# Altium integrated library Weidmueller_OMNIMATE_Signal.IntLib: 2550 symbols (part 10 of 45) (continued)
## 1331770000 (continued)
OMNIMATE Signal - series LMF; PartNumber: 1331770000; Manufacturer: Weidmueller; Short_text_for_material: LMF 5.00/08/90 3.5SN OR BX; Pitch_mm: 5 mm; Pitch_inch: 0,197 inch; No_of_poles: 8; Solder_pin_length_mm: 3,5 mm; Contact_material: CuSn; Contact_surface: tinned; Insulating_material: Wemid (PA); UL_94_flammability_rating: V-0; Rated_voltage_for_surge_voltage_class_pollution_degree_II_2: 400 V; Rated_current_min_no_of_poles_TU_20_deg_C: 32 A; Solid_min_H05_07_V_U: 0,2 mm²; Solid_max_H05_07_V_U: 2,5 mm²; Rated_voltage_use_group_B_UL_1059: 300 V; Rated_current_use_group_B_UL_1059: 20 A; Wire_cross_section_AWG_min_UL_1059: AWG 26; Wire_cross_section_AWG_max_UL_1059: AWG 12; PackageReference: LMF_5_00_90_08; Colour: Orange; Packaging: Box; Qty: 35 PCS; Revision: V1; ComponentLink1Description: Manufacturer URL; ComponentLink1URL: http://www.weidmueller.com/; ComponentLink2Description: URL Link1; ComponentLink2URL: http://catalog.weidmueller.com/catalog/Start.do?localeId=en&ObjectID=1331770000
footprint LMF_5_00_90_08 (OMNIMATE Signal - Serie LMF  LMF 5.00/08/90 3.5SN)
pins: A1, A2, A3, A4, A5, A6, A7, A8
1 alternate drawing of the same symbol

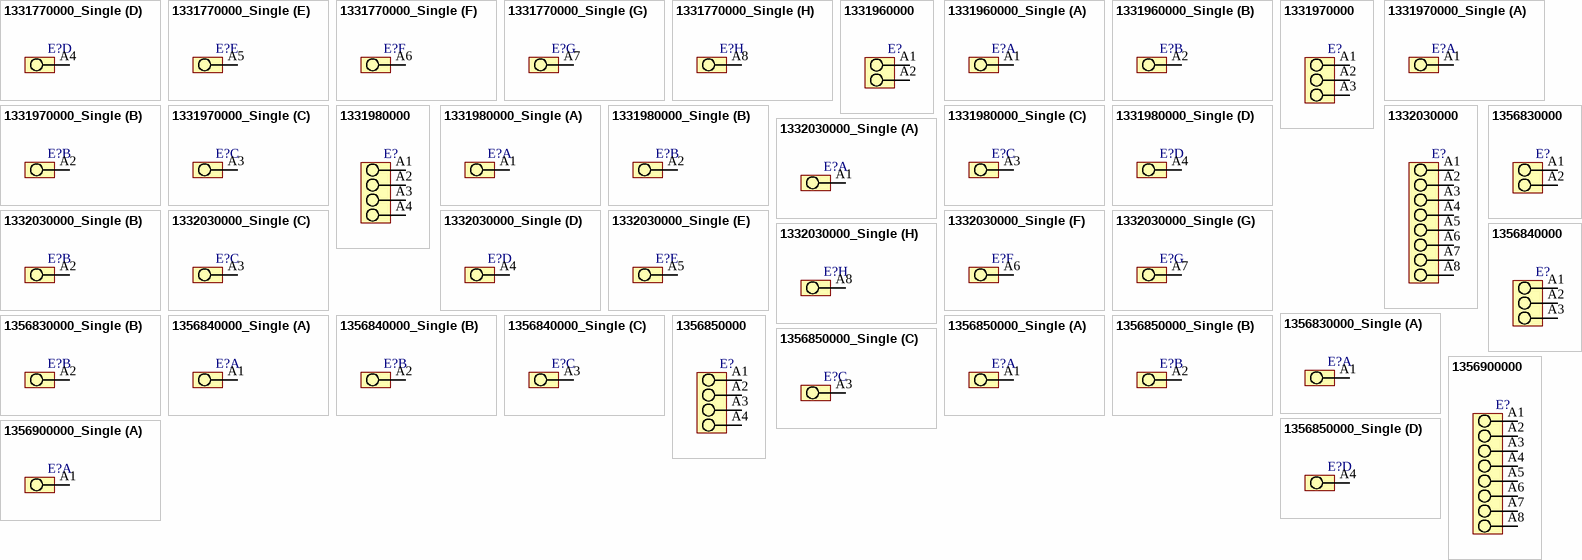
[diagram p57: symbols 1331770000_Single to 1356900000_Single]

## 1331770000_Single
designator E?
OMNIMATE Signal - series LMF; PartNumber: 1331770000; Manufacturer: Weidmueller; Short_text_for_material: LMF 5.00/08/90 3.5SN OR BX; Pitch_mm: 5 mm; Pitch_inch: 0,197 inch; No_of_poles: 8; Solder_pin_length_mm: 3,5 mm; Contact_material: CuSn; Contact_surface: tinned; Insulating_material: Wemid (PA); UL_94_flammability_rating: V-0; Rated_voltage_for_surge_voltage_class_pollution_degree_II_2: 400 V; Rated_current_min_no_of_poles_TU_20_deg_C: 32 A; Solid_min_H05_07_V_U: 0,2 mm²; Solid_max_H05_07_V_U: 2,5 mm²; Rated_voltage_use_group_B_UL_1059: 300 V; Rated_current_use_group_B_UL_1059: 20 A; Wire_cross_section_AWG_min_UL_1059: AWG 26; Wire_cross_section_AWG_max_UL_1059: AWG 12; PackageReference: LMF_5_00_90_08; Colour: Orange; Packaging: Box; Qty: 35 PCS; Revision: V1; ComponentLink1Description: Manufacturer URL; ComponentLink1URL: http://www.weidmueller.com/; ComponentLink2Description: URL Link1; ComponentLink2URL: http://catalog.weidmueller.com/catalog/Start.do?localeId=en&ObjectID=1331770000
footprint LMF_5_00_90_08 (OMNIMATE Signal - Serie LMF  LMF 5.00/08/90 3.5SN)
part A pins: A1
part B pins: A2
part C pins: A3
part D pins: A4
part E pins: A5
part F pins: A6
part G pins: A7
part H pins: A8
1 alternate drawing of the same symbol

## 1331960000
designator E?
OMNIMATE Signal - series LMF; PartNumber: 1331960000; Manufacturer: Weidmueller; Short_text_for_material: LMFS 5.00/02/90 3.5SN OR BX; Pitch_mm: 5 mm; Pitch_inch: 0,197 inch; No_of_poles: 2; Solder_pin_length_mm: 3,5 mm; Contact_material: CuSn; Contact_surface: tinned; Insulating_material: Wemid (PA); UL_94_flammability_rating: V-0; Rated_voltage_for_surge_voltage_class_pollution_degree_II_2: 400 V; Rated_current_min_no_of_poles_TU_20_deg_C: 32 A; Solid_min_H05_07_V_U: 0,2 mm²; Solid_max_H05_07_V_U: 2,5 mm²; Rated_voltage_use_group_B_UL_1059: 300 V; Rated_current_use_group_B_UL_1059: 20 A; Wire_cross_section_AWG_min_UL_1059: AWG 26; Wire_cross_section_AWG_max_UL_1059: AWG 12; PackageReference: LMFS_5_00_90_02; Colour: Orange; Packaging: Box; Qty: 130 PCS; Revision: V1; ComponentLink1Description: Manufacturer URL; ComponentLink1URL: http://www.weidmueller.com/; ComponentLink2Description: URL Link1; ComponentLink2URL: http://catalog.weidmueller.com/catalog/Start.do?localeId=en&ObjectID=1331960000
footprint LMFS_5_00_90_02 (OMNIMATE Signal - Serie LMF  LMFS 5.00/02/90 3.5)
pins: A1, A2
1 alternate drawing of the same symbol

## 1331960000_Single
designator E?
OMNIMATE Signal - series LMF; PartNumber: 1331960000; Manufacturer: Weidmueller; Short_text_for_material: LMFS 5.00/02/90 3.5SN OR BX; Pitch_mm: 5 mm; Pitch_inch: 0,197 inch; No_of_poles: 2; Solder_pin_length_mm: 3,5 mm; Contact_material: CuSn; Contact_surface: tinned; Insulating_material: Wemid (PA); UL_94_flammability_rating: V-0; Rated_voltage_for_surge_voltage_class_pollution_degree_II_2: 400 V; Rated_current_min_no_of_poles_TU_20_deg_C: 32 A; Solid_min_H05_07_V_U: 0,2 mm²; Solid_max_H05_07_V_U: 2,5 mm²; Rated_voltage_use_group_B_UL_1059: 300 V; Rated_current_use_group_B_UL_1059: 20 A; Wire_cross_section_AWG_min_UL_1059: AWG 26; Wire_cross_section_AWG_max_UL_1059: AWG 12; PackageReference: LMFS_5_00_90_02; Colour: Orange; Packaging: Box; Qty: 130 PCS; Revision: V1; ComponentLink1Description: Manufacturer URL; ComponentLink1URL: http://www.weidmueller.com/; ComponentLink2Description: URL Link1; ComponentLink2URL: http://catalog.weidmueller.com/catalog/Start.do?localeId=en&ObjectID=1331960000
footprint LMFS_5_00_90_02 (OMNIMATE Signal - Serie LMF  LMFS 5.00/02/90 3.5)
part A pins: A1
part B pins: A2
1 alternate drawing of the same symbol

## 1331970000
designator E?
OMNIMATE Signal - series LMF; PartNumber: 1331970000; Manufacturer: Weidmueller; Short_text_for_material: LMFS 5.00/03/90 3.5SN OR BX; Pitch_mm: 5 mm; Pitch_inch: 0,197 inch; No_of_poles: 3; Solder_pin_length_mm: 3,5 mm; Contact_material: CuSn; Contact_surface: tinned; Insulating_material: Wemid (PA); UL_94_flammability_rating: V-0; Rated_voltage_for_surge_voltage_class_pollution_degree_II_2: 400 V; Rated_current_min_no_of_poles_TU_20_deg_C: 32 A; Solid_min_H05_07_V_U: 0,2 mm²; Solid_max_H05_07_V_U: 2,5 mm²; Rated_voltage_use_group_B_UL_1059: 300 V; Rated_current_use_group_B_UL_1059: 20 A; Wire_cross_section_AWG_min_UL_1059: AWG 26; Wire_cross_section_AWG_max_UL_1059: AWG 12; PackageReference: LMFS_5_00_90_03; Colour: Orange; Packaging: Box; Qty: 90 PCS; Revision: V1; ComponentLink1Description: Manufacturer URL; ComponentLink1URL: http://www.weidmueller.com/; ComponentLink2Description: URL Link1; ComponentLink2URL: http://catalog.weidmueller.com/catalog/Start.do?localeId=en&ObjectID=1331970000
footprint LMFS_5_00_90_03 (OMNIMATE Signal - Serie LMF  LMFS 5.00/03/90 3.5)
pins: A1, A2, A3
1 alternate drawing of the same symbol

## 1331970000_Single
designator E?
OMNIMATE Signal - series LMF; PartNumber: 1331970000; Manufacturer: Weidmueller; Short_text_for_material: LMFS 5.00/03/90 3.5SN OR BX; Pitch_mm: 5 mm; Pitch_inch: 0,197 inch; No_of_poles: 3; Solder_pin_length_mm: 3,5 mm; Contact_material: CuSn; Contact_surface: tinned; Insulating_material: Wemid (PA); UL_94_flammability_rating: V-0; Rated_voltage_for_surge_voltage_class_pollution_degree_II_2: 400 V; Rated_current_min_no_of_poles_TU_20_deg_C: 32 A; Solid_min_H05_07_V_U: 0,2 mm²; Solid_max_H05_07_V_U: 2,5 mm²; Rated_voltage_use_group_B_UL_1059: 300 V; Rated_current_use_group_B_UL_1059: 20 A; Wire_cross_section_AWG_min_UL_1059: AWG 26; Wire_cross_section_AWG_max_UL_1059: AWG 12; PackageReference: LMFS_5_00_90_03; Colour: Orange; Packaging: Box; Qty: 90 PCS; Revision: V1; ComponentLink1Description: Manufacturer URL; ComponentLink1URL: http://www.weidmueller.com/; ComponentLink2Description: URL Link1; ComponentLink2URL: http://catalog.weidmueller.com/catalog/Start.do?localeId=en&ObjectID=1331970000
footprint LMFS_5_00_90_03 (OMNIMATE Signal - Serie LMF  LMFS 5.00/03/90 3.5)
part A pins: A1
part B pins: A2
part C pins: A3
1 alternate drawing of the same symbol

## 1331980000
designator E?
OMNIMATE Signal - series LMF; PartNumber: 1331980000; Manufacturer: Weidmueller; Short_text_for_material: LMFS 5.00/04/90 3.5SN OR BX; Pitch_mm: 5 mm; Pitch_inch: 0,197 inch; No_of_poles: 4; Solder_pin_length_mm: 3,5 mm; Contact_material: CuSn; Contact_surface: tinned; Insulating_material: Wemid (PA); UL_94_flammability_rating: V-0; Rated_voltage_for_surge_voltage_class_pollution_degree_II_2: 400 V; Rated_current_min_no_of_poles_TU_20_deg_C: 32 A; Solid_min_H05_07_V_U: 0,2 mm²; Solid_max_H05_07_V_U: 2,5 mm²; Rated_voltage_use_group_B_UL_1059: 300 V; Rated_current_use_group_B_UL_1059: 20 A; Wire_cross_section_AWG_min_UL_1059: AWG 26; Wire_cross_section_AWG_max_UL_1059: AWG 12; PackageReference: LMFS_5_00_90_04; Colour: Orange; Packaging: Box; Qty: 70 PCS; Revision: V1; ComponentLink1Description: Manufacturer URL; ComponentLink1URL: http://www.weidmueller.com/; ComponentLink2Description: URL Link1; ComponentLink2URL: http://catalog.weidmueller.com/catalog/Start.do?localeId=en&ObjectID=1331980000
footprint LMFS_5_00_90_04 (OMNIMATE Signal - Serie LMF  LMFS 5.00/04/90 3.5)
pins: A1, A2, A3, A4
1 alternate drawing of the same symbol

## 1331980000_Single
designator E?
OMNIMATE Signal - series LMF; PartNumber: 1331980000; Manufacturer: Weidmueller; Short_text_for_material: LMFS 5.00/04/90 3.5SN OR BX; Pitch_mm: 5 mm; Pitch_inch: 0,197 inch; No_of_poles: 4; Solder_pin_length_mm: 3,5 mm; Contact_material: CuSn; Contact_surface: tinned; Insulating_material: Wemid (PA); UL_94_flammability_rating: V-0; Rated_voltage_for_surge_voltage_class_pollution_degree_II_2: 400 V; Rated_current_min_no_of_poles_TU_20_deg_C: 32 A; Solid_min_H05_07_V_U: 0,2 mm²; Solid_max_H05_07_V_U: 2,5 mm²; Rated_voltage_use_group_B_UL_1059: 300 V; Rated_current_use_group_B_UL_1059: 20 A; Wire_cross_section_AWG_min_UL_1059: AWG 26; Wire_cross_section_AWG_max_UL_1059: AWG 12; PackageReference: LMFS_5_00_90_04; Colour: Orange; Packaging: Box; Qty: 70 PCS; Revision: V1; ComponentLink1Description: Manufacturer URL; ComponentLink1URL: http://www.weidmueller.com/; ComponentLink2Description: URL Link1; ComponentLink2URL: http://catalog.weidmueller.com/catalog/Start.do?localeId=en&ObjectID=1331980000
footprint LMFS_5_00_90_04 (OMNIMATE Signal - Serie LMF  LMFS 5.00/04/90 3.5)
part A pins: A1
part B pins: A2
part C pins: A3
part D pins: A4
1 alternate drawing of the same symbol

## 1332030000
designator E?
OMNIMATE Signal - series LMF; PartNumber: 1332030000; Manufacturer: Weidmueller; Short_text_for_material: LMFS 5.00/08/90 3.5SN OR BX; Pitch_mm: 5 mm; Pitch_inch: 0,197 inch; No_of_poles: 8; Solder_pin_length_mm: 3,5 mm; Contact_material: CuSn; Contact_surface: tinned; Insulating_material: Wemid (PA); UL_94_flammability_rating: V-0; Rated_voltage_for_surge_voltage_class_pollution_degree_II_2: 400 V; Rated_current_min_no_of_poles_TU_20_deg_C: 32 A; Solid_min_H05_07_V_U: 0,2 mm²; Solid_max_H05_07_V_U: 2,5 mm²; Rated_voltage_use_group_B_UL_1059: 300 V; Rated_current_use_group_B_UL_1059: 20 A; Wire_cross_section_AWG_min_UL_1059: AWG 26; Wire_cross_section_AWG_max_UL_1059: AWG 12; PackageReference: LMFS_5_00_90_08; Colour: Orange; Packaging: Box; Qty: 35 PCS; Revision: V1; ComponentLink1Description: Manufacturer URL; ComponentLink1URL: http://www.weidmueller.com/; ComponentLink2Description: URL Link1; ComponentLink2URL: http://catalog.weidmueller.com/catalog/Start.do?localeId=en&ObjectID=1332030000
footprint LMFS_5_00_90_08 (OMNIMATE Signal - Serie LMF  LMFS 5.00/08/90 3.5)
pins: A1, A2, A3, A4, A5, A6, A7, A8
1 alternate drawing of the same symbol

## 1332030000_Single
designator E?
OMNIMATE Signal - series LMF; PartNumber: 1332030000; Manufacturer: Weidmueller; Short_text_for_material: LMFS 5.00/08/90 3.5SN OR BX; Pitch_mm: 5 mm; Pitch_inch: 0,197 inch; No_of_poles: 8; Solder_pin_length_mm: 3,5 mm; Contact_material: CuSn; Contact_surface: tinned; Insulating_material: Wemid (PA); UL_94_flammability_rating: V-0; Rated_voltage_for_surge_voltage_class_pollution_degree_II_2: 400 V; Rated_current_min_no_of_poles_TU_20_deg_C: 32 A; Solid_min_H05_07_V_U: 0,2 mm²; Solid_max_H05_07_V_U: 2,5 mm²; Rated_voltage_use_group_B_UL_1059: 300 V; Rated_current_use_group_B_UL_1059: 20 A; Wire_cross_section_AWG_min_UL_1059: AWG 26; Wire_cross_section_AWG_max_UL_1059: AWG 12; PackageReference: LMFS_5_00_90_08; Colour: Orange; Packaging: Box; Qty: 35 PCS; Revision: V1; ComponentLink1Description: Manufacturer URL; ComponentLink1URL: http://www.weidmueller.com/; ComponentLink2Description: URL Link1; ComponentLink2URL: http://catalog.weidmueller.com/catalog/Start.do?localeId=en&ObjectID=1332030000
footprint LMFS_5_00_90_08 (OMNIMATE Signal - Serie LMF  LMFS 5.00/08/90 3.5)
part A pins: A1
part B pins: A2
part C pins: A3
part D pins: A4
part E pins: A5
part F pins: A6
part G pins: A7
part H pins: A8
1 alternate drawing of the same symbol

## 1356830000
designator E?
OMNIMATE Signal - series LL; PartNumber: 1356830000; Manufacturer: Weidmueller; Short_text_for_material: LL 6.35/02/90V 5.0SN BK BX; Side_termination_characteristic: closed side; Mounting_onto_the_PCB: Solder connection; Pitch_mm: 6,35 mm; Pitch_inch: 0,25 inch; No_of_poles: 2; Solder_pin_length_mm: 5 mm; Contact_material: Cu-Leg; Contact_surface: tinned; Insulating_material: Wemid (PA); UL_94_flammability_rating: V-0; Rated_voltage_for_surge_voltage_class_pollution_degree_II_2: 1000 V; Rated_current_min_no_of_poles_TU_20_deg_C: 32 A; Solid_min_H05_07_V_U: 0,18 mm²; Solid_max_H05_07_V_U: 6 mm²; Rated_voltage_use_group_B_UL_1059: 600 V; Rated_current_use_group_B_UL_1059: 30 A; Wire_cross_section_AWG_min_UL_1059: AWG 26; Wire_cross_section_AWG_max_UL_1059: AWG 10; PackageReference: LL_6_35_90V_02; Colour: Black; Packaging: Box; Qty: 50 PCS; Revision: V1; ComponentLink1Description: Manufacturer URL; ComponentLink1URL: http://www.weidmueller.com/; ComponentLink2Description: URL Link1; ComponentLink2URL: http://catalog.weidmueller.com/catalog/Start.do?localeId=en&ObjectID=1356830000
footprint LL_6_35_90V_02 (OMNIMATE Signal - Serie LL  LL 6.35/02/90V 5.0)
pins: A1, A2
1 alternate drawing of the same symbol

## 1356830000_Single
designator E?
OMNIMATE Signal - series LL; PartNumber: 1356830000; Manufacturer: Weidmueller; Short_text_for_material: LL 6.35/02/90V 5.0SN BK BX; Side_termination_characteristic: closed side; Mounting_onto_the_PCB: Solder connection; Pitch_mm: 6,35 mm; Pitch_inch: 0,25 inch; No_of_poles: 2; Solder_pin_length_mm: 5 mm; Contact_material: Cu-Leg; Contact_surface: tinned; Insulating_material: Wemid (PA); UL_94_flammability_rating: V-0; Rated_voltage_for_surge_voltage_class_pollution_degree_II_2: 1000 V; Rated_current_min_no_of_poles_TU_20_deg_C: 32 A; Solid_min_H05_07_V_U: 0,18 mm²; Solid_max_H05_07_V_U: 6 mm²; Rated_voltage_use_group_B_UL_1059: 600 V; Rated_current_use_group_B_UL_1059: 30 A; Wire_cross_section_AWG_min_UL_1059: AWG 26; Wire_cross_section_AWG_max_UL_1059: AWG 10; PackageReference: LL_6_35_90V_02; Colour: Black; Packaging: Box; Qty: 50 PCS; Revision: V1; ComponentLink1Description: Manufacturer URL; ComponentLink1URL: http://www.weidmueller.com/; ComponentLink2Description: URL Link1; ComponentLink2URL: http://catalog.weidmueller.com/catalog/Start.do?localeId=en&ObjectID=1356830000
footprint LL_6_35_90V_02 (OMNIMATE Signal - Serie LL  LL 6.35/02/90V 5.0)
part A pins: A1
part B pins: A2
1 alternate drawing of the same symbol

## 1356840000
designator E?
OMNIMATE Signal - series LL; PartNumber: 1356840000; Manufacturer: Weidmueller; Short_text_for_material: LL 6.35/03/90V 5.0SN BK BX; Side_termination_characteristic: closed side; Mounting_onto_the_PCB: Solder connection; Pitch_mm: 6,35 mm; Pitch_inch: 0,25 inch; No_of_poles: 3; Solder_pin_length_mm: 5 mm; Contact_material: Cu-Leg; Contact_surface: tinned; Insulating_material: Wemid (PA); UL_94_flammability_rating: V-0; Rated_voltage_for_surge_voltage_class_pollution_degree_II_2: 1000 V; Rated_current_min_no_of_poles_TU_20_deg_C: 32 A; Solid_min_H05_07_V_U: 0,18 mm²; Solid_max_H05_07_V_U: 6 mm²; Rated_voltage_use_group_B_UL_1059: 600 V; Rated_current_use_group_B_UL_1059: 30 A; Wire_cross_section_AWG_min_UL_1059: AWG 26; Wire_cross_section_AWG_max_UL_1059: AWG 10; PackageReference: LL_6_35_90V_03; Colour: Black; Packaging: Box; Qty: 50 PCS; Revision: V1; ComponentLink1Description: Manufacturer URL; ComponentLink1URL: http://www.weidmueller.com/; ComponentLink2Description: URL Link1; ComponentLink2URL: http://catalog.weidmueller.com/catalog/Start.do?localeId=en&ObjectID=1356840000
footprint LL_6_35_90V_03 (OMNIMATE Signal - Serie LL  LL 6.35/03/90V 5.0)
pins: A1, A2, A3
1 alternate drawing of the same symbol

## 1356840000_Single
designator E?
OMNIMATE Signal - series LL; PartNumber: 1356840000; Manufacturer: Weidmueller; Short_text_for_material: LL 6.35/03/90V 5.0SN BK BX; Side_termination_characteristic: closed side; Mounting_onto_the_PCB: Solder connection; Pitch_mm: 6,35 mm; Pitch_inch: 0,25 inch; No_of_poles: 3; Solder_pin_length_mm: 5 mm; Contact_material: Cu-Leg; Contact_surface: tinned; Insulating_material: Wemid (PA); UL_94_flammability_rating: V-0; Rated_voltage_for_surge_voltage_class_pollution_degree_II_2: 1000 V; Rated_current_min_no_of_poles_TU_20_deg_C: 32 A; Solid_min_H05_07_V_U: 0,18 mm²; Solid_max_H05_07_V_U: 6 mm²; Rated_voltage_use_group_B_UL_1059: 600 V; Rated_current_use_group_B_UL_1059: 30 A; Wire_cross_section_AWG_min_UL_1059: AWG 26; Wire_cross_section_AWG_max_UL_1059: AWG 10; PackageReference: LL_6_35_90V_03; Colour: Black; Packaging: Box; Qty: 50 PCS; Revision: V1; ComponentLink1Description: Manufacturer URL; ComponentLink1URL: http://www.weidmueller.com/; ComponentLink2Description: URL Link1; ComponentLink2URL: http://catalog.weidmueller.com/catalog/Start.do?localeId=en&ObjectID=1356840000
footprint LL_6_35_90V_03 (OMNIMATE Signal - Serie LL  LL 6.35/03/90V 5.0)
part A pins: A1
part B pins: A2
part C pins: A3
1 alternate drawing of the same symbol

## 1356850000
designator E?
OMNIMATE Signal - series LL; PartNumber: 1356850000; Manufacturer: Weidmueller; Short_text_for_material: LL 6.35/04/90V 5.0SN BK BX; Side_termination_characteristic: closed side; Mounting_onto_the_PCB: Solder connection; Pitch_mm: 6,35 mm; Pitch_inch: 0,25 inch; No_of_poles: 4; Solder_pin_length_mm: 5 mm; Contact_material: Cu-Leg; Contact_surface: tinned; Insulating_material: Wemid (PA); UL_94_flammability_rating: V-0; Rated_voltage_for_surge_voltage_class_pollution_degree_II_2: 1000 V; Rated_current_min_no_of_poles_TU_20_deg_C: 32 A; Solid_min_H05_07_V_U: 0,18 mm²; Solid_max_H05_07_V_U: 6 mm²; Rated_voltage_use_group_B_UL_1059: 600 V; Rated_current_use_group_B_UL_1059: 30 A; Wire_cross_section_AWG_min_UL_1059: AWG 26; Wire_cross_section_AWG_max_UL_1059: AWG 10; PackageReference: LL_6_35_90V_04; Colour: Black; Packaging: Box; Qty: 50 PCS; Revision: V1; ComponentLink1Description: Manufacturer URL; ComponentLink1URL: http://www.weidmueller.com/; ComponentLink2Description: URL Link1; ComponentLink2URL: http://catalog.weidmueller.com/catalog/Start.do?localeId=en&ObjectID=1356850000
footprint LL_6_35_90V_04 (OMNIMATE Signal - Serie LL  LL 6.35/04/90V 5.0)
pins: A1, A2, A3, A4
1 alternate drawing of the same symbol

## 1356850000_Single
designator E?
OMNIMATE Signal - series LL; PartNumber: 1356850000; Manufacturer: Weidmueller; Short_text_for_material: LL 6.35/04/90V 5.0SN BK BX; Side_termination_characteristic: closed side; Mounting_onto_the_PCB: Solder connection; Pitch_mm: 6,35 mm; Pitch_inch: 0,25 inch; No_of_poles: 4; Solder_pin_length_mm: 5 mm; Contact_material: Cu-Leg; Contact_surface: tinned; Insulating_material: Wemid (PA); UL_94_flammability_rating: V-0; Rated_voltage_for_surge_voltage_class_pollution_degree_II_2: 1000 V; Rated_current_min_no_of_poles_TU_20_deg_C: 32 A; Solid_min_H05_07_V_U: 0,18 mm²; Solid_max_H05_07_V_U: 6 mm²; Rated_voltage_use_group_B_UL_1059: 600 V; Rated_current_use_group_B_UL_1059: 30 A; Wire_cross_section_AWG_min_UL_1059: AWG 26; Wire_cross_section_AWG_max_UL_1059: AWG 10; PackageReference: LL_6_35_90V_04; Colour: Black; Packaging: Box; Qty: 50 PCS; Revision: V1; ComponentLink1Description: Manufacturer URL; ComponentLink1URL: http://www.weidmueller.com/; ComponentLink2Description: URL Link1; ComponentLink2URL: http://catalog.weidmueller.com/catalog/Start.do?localeId=en&ObjectID=1356850000
footprint LL_6_35_90V_04 (OMNIMATE Signal - Serie LL  LL 6.35/04/90V 5.0)
part A pins: A1
part B pins: A2
part C pins: A3
part D pins: A4
1 alternate drawing of the same symbol

## 1356900000
designator E?
OMNIMATE Signal - series LL; PartNumber: 1356900000; Manufacturer: Weidmueller; Short_text_for_material: LL 6.35/08/90V 5.0SN BK BX; Side_termination_characteristic: closed side; Mounting_onto_the_PCB: Solder connection; Pitch_mm: 6,35 mm; Pitch_inch: 0,25 inch; No_of_poles: 8; Solder_pin_length_mm: 5 mm; Contact_material: Cu-Leg; Contact_surface: tinned; Insulating_material: Wemid (PA); UL_94_flammability_rating: V-0; Rated_voltage_for_surge_voltage_class_pollution_degree_II_2: 1000 V; Rated_current_min_no_of_poles_TU_20_deg_C: 32 A; Solid_min_H05_07_V_U: 0,18 mm²; Solid_max_H05_07_V_U: 6 mm²; Rated_voltage_use_group_B_UL_1059: 600 V; Rated_current_use_group_B_UL_1059: 30 A; Wire_cross_section_AWG_min_UL_1059: AWG 26; Wire_cross_section_AWG_max_UL_1059: AWG 10; PackageReference: LL_6_35_90V_08; Colour: Black; Packaging: Box; Qty: 50 PCS; Revision: V1; ComponentLink1Description: Manufacturer URL; ComponentLink1URL: http://www.weidmueller.com/; ComponentLink2Description: URL Link1; ComponentLink2URL: http://catalog.weidmueller.com/catalog/Start.do?localeId=en&ObjectID=1356900000
footprint LL_6_35_90V_08 (OMNIMATE Signal - Serie LL  LL 6.35/08/90V 5.0)
pins: A1, A2, A3, A4, A5, A6, A7, A8
1 alternate drawing of the same symbol

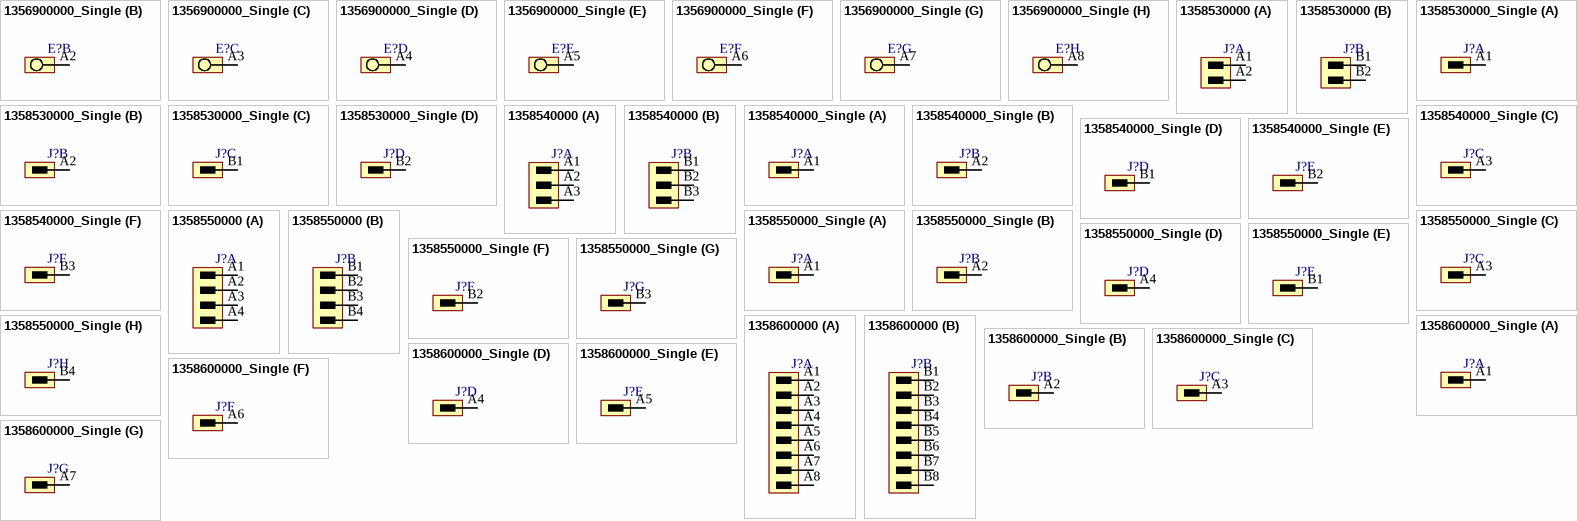
[diagram p58: symbols 1356900000_Single to 1358600000_Single]

## 1356900000_Single
designator E?
OMNIMATE Signal - series LL; PartNumber: 1356900000; Manufacturer: Weidmueller; Short_text_for_material: LL 6.35/08/90V 5.0SN BK BX; Side_termination_characteristic: closed side; Mounting_onto_the_PCB: Solder connection; Pitch_mm: 6,35 mm; Pitch_inch: 0,25 inch; No_of_poles: 8; Solder_pin_length_mm: 5 mm; Contact_material: Cu-Leg; Contact_surface: tinned; Insulating_material: Wemid (PA); UL_94_flammability_rating: V-0; Rated_voltage_for_surge_voltage_class_pollution_degree_II_2: 1000 V; Rated_current_min_no_of_poles_TU_20_deg_C: 32 A; Solid_min_H05_07_V_U: 0,18 mm²; Solid_max_H05_07_V_U: 6 mm²; Rated_voltage_use_group_B_UL_1059: 600 V; Rated_current_use_group_B_UL_1059: 30 A; Wire_cross_section_AWG_min_UL_1059: AWG 26; Wire_cross_section_AWG_max_UL_1059: AWG 10; PackageReference: LL_6_35_90V_08; Colour: Black; Packaging: Box; Qty: 50 PCS; Revision: V1; ComponentLink1Description: Manufacturer URL; ComponentLink1URL: http://www.weidmueller.com/; ComponentLink2Description: URL Link1; ComponentLink2URL: http://catalog.weidmueller.com/catalog/Start.do?localeId=en&ObjectID=1356900000
footprint LL_6_35_90V_08 (OMNIMATE Signal - Serie LL  LL 6.35/08/90V 5.0)
part A pins: A1
part B pins: A2
part C pins: A3
part D pins: A4
part E pins: A5
part F pins: A6
part G pins: A7
part H pins: A8
1 alternate drawing of the same symbol

## 1358530000
designator J?
OMNIMATE Signal - series B2C/S2C 3.50 - 2-row; PartNumber: 1358530000; Manufacturer: Weidmueller; Short_text_for_material: S2C-SMT 3.50/04/180LF 3.5SN BK RL; Side_termination_characteristic: Solder flange; Mounting_onto_the_PCB: Reflow solder connection; Pitch_mm: 3.5 mm; Pitch_inch: 0.138 inch; No_of_poles: 4; Outgoing_elbow: 180°; Insulating_material: LCP GF; UL_94_flammability_rating: V-0; Rated_voltage_for_surge_voltage_class_pollution_degree_II_2: 200 V; Rated_current_min_no_of_poles_TU_20_deg_C: 13.4 A; Rated_voltage_use_group_B_UL_1059: 150 V; Rated_current_use_group_B_UL_1059: 10 A; PackageReference: S2C_SMT_3_50_180LF_04; Colour: Black; Solder_pin_length_mm: 3.5 mm; Packaging: Tape; Qty: 175 PCS; Revision: V1; ComponentLink1Description: Manufacturer URL; ComponentLink1URL: http://www.weidmueller.com/; ComponentLink2Description: URL Link1; ComponentLink2URL: http://catalog.weidmueller.com/catalog/Start.do?localeId=en&ObjectID=1358530000
footprint S2C_SMT_3_50_180LF_04 (OMNIMATE Signal - Serie B2C/S2C 3.50 - 2-reihig  S2C-SMT 3.50/04/180LF 3.5)
part A pins: A1, A2
part B pins: B1, B2

## 1358530000_Single
designator J?
OMNIMATE Signal - series B2C/S2C 3.50 - 2-row; PartNumber: 1358530000; Manufacturer: Weidmueller; Short_text_for_material: S2C-SMT 3.50/04/180LF 3.5SN BK RL; Side_termination_characteristic: Solder flange; Mounting_onto_the_PCB: Reflow solder connection; Pitch_mm: 3.5 mm; Pitch_inch: 0.138 inch; No_of_poles: 4; Outgoing_elbow: 180°; Insulating_material: LCP GF; UL_94_flammability_rating: V-0; Rated_voltage_for_surge_voltage_class_pollution_degree_II_2: 200 V; Rated_current_min_no_of_poles_TU_20_deg_C: 13.4 A; Rated_voltage_use_group_B_UL_1059: 150 V; Rated_current_use_group_B_UL_1059: 10 A; PackageReference: S2C_SMT_3_50_180LF_04; Colour: Black; Solder_pin_length_mm: 3.5 mm; Packaging: Tape; Qty: 175 PCS; Revision: V1; ComponentLink1Description: Manufacturer URL; ComponentLink1URL: http://www.weidmueller.com/; ComponentLink2Description: URL Link1; ComponentLink2URL: http://catalog.weidmueller.com/catalog/Start.do?localeId=en&ObjectID=1358530000
footprint S2C_SMT_3_50_180LF_04 (OMNIMATE Signal - Serie B2C/S2C 3.50 - 2-reihig  S2C-SMT 3.50/04/180LF 3.5)
part A pins: A1
part B pins: A2
part C pins: B1
part D pins: B2

## 1358540000
designator J?
OMNIMATE Signal - series B2C/S2C 3.50 - 2-row; PartNumber: 1358540000; Manufacturer: Weidmueller; Short_text_for_material: S2C-SMT 3.50/06/180LF 3.5SN BK RL; Side_termination_characteristic: Solder flange; Mounting_onto_the_PCB: Reflow solder connection; Pitch_mm: 3.5 mm; Pitch_inch: 0.138 inch; No_of_poles: 6; Outgoing_elbow: 180°; Insulating_material: LCP GF; UL_94_flammability_rating: V-0; Rated_voltage_for_surge_voltage_class_pollution_degree_II_2: 200 V; Rated_current_min_no_of_poles_TU_20_deg_C: 13.4 A; Rated_voltage_use_group_B_UL_1059: 150 V; Rated_current_use_group_B_UL_1059: 10 A; PackageReference: S2C_SMT_3_50_180LF_06; Colour: Black; Solder_pin_length_mm: 3.5 mm; Packaging: Tape; Qty: 175 PCS; Revision: V1; ComponentLink1Description: Manufacturer URL; ComponentLink1URL: http://www.weidmueller.com/; ComponentLink2Description: URL Link1; ComponentLink2URL: http://catalog.weidmueller.com/catalog/Start.do?localeId=en&ObjectID=1358540000
footprint S2C_SMT_3_50_180LF_06 (OMNIMATE Signal - Serie B2C/S2C 3.50 - 2-reihig  S2C-SMT 3.50/06/180LF 3.5)
part A pins: A1, A2, A3
part B pins: B1, B2, B3

## 1358540000_Single
designator J?
OMNIMATE Signal - series B2C/S2C 3.50 - 2-row; PartNumber: 1358540000; Manufacturer: Weidmueller; Short_text_for_material: S2C-SMT 3.50/06/180LF 3.5SN BK RL; Side_termination_characteristic: Solder flange; Mounting_onto_the_PCB: Reflow solder connection; Pitch_mm: 3.5 mm; Pitch_inch: 0.138 inch; No_of_poles: 6; Outgoing_elbow: 180°; Insulating_material: LCP GF; UL_94_flammability_rating: V-0; Rated_voltage_for_surge_voltage_class_pollution_degree_II_2: 200 V; Rated_current_min_no_of_poles_TU_20_deg_C: 13.4 A; Rated_voltage_use_group_B_UL_1059: 150 V; Rated_current_use_group_B_UL_1059: 10 A; PackageReference: S2C_SMT_3_50_180LF_06; Colour: Black; Solder_pin_length_mm: 3.5 mm; Packaging: Tape; Qty: 175 PCS; Revision: V1; ComponentLink1Description: Manufacturer URL; ComponentLink1URL: http://www.weidmueller.com/; ComponentLink2Description: URL Link1; ComponentLink2URL: http://catalog.weidmueller.com/catalog/Start.do?localeId=en&ObjectID=1358540000
footprint S2C_SMT_3_50_180LF_06 (OMNIMATE Signal - Serie B2C/S2C 3.50 - 2-reihig  S2C-SMT 3.50/06/180LF 3.5)
part A pins: A1
part B pins: A2
part C pins: A3
part D pins: B1
part E pins: B2
part F pins: B3

## 1358550000
designator J?
OMNIMATE Signal - series B2C/S2C 3.50 - 2-row; PartNumber: 1358550000; Manufacturer: Weidmueller; Short_text_for_material: S2C-SMT 3.50/08/180LF 3.5SN BK RL; Side_termination_characteristic: Solder flange; Mounting_onto_the_PCB: Reflow solder connection; Pitch_mm: 3.5 mm; Pitch_inch: 0.138 inch; No_of_poles: 8; Outgoing_elbow: 180°; Insulating_material: LCP GF; UL_94_flammability_rating: V-0; Rated_voltage_for_surge_voltage_class_pollution_degree_II_2: 200 V; Rated_current_min_no_of_poles_TU_20_deg_C: 13.4 A; Rated_voltage_use_group_B_UL_1059: 150 V; Rated_current_use_group_B_UL_1059: 10 A; PackageReference: S2C_SMT_3_50_180LF_08; Colour: Black; Solder_pin_length_mm: 3.5 mm; Packaging: Tape; Qty: 175 PCS; Revision: V1; ComponentLink1Description: Manufacturer URL; ComponentLink1URL: http://www.weidmueller.com/; ComponentLink2Description: URL Link1; ComponentLink2URL: http://catalog.weidmueller.com/catalog/Start.do?localeId=en&ObjectID=1358550000
footprint S2C_SMT_3_50_180LF_08 (OMNIMATE Signal - Serie B2C/S2C 3.50 - 2-reihig  S2C-SMT 3.50/08/180LF 3.5)
part A pins: A1, A2, A3, A4
part B pins: B1, B2, B3, B4

## 1358550000_Single
designator J?
OMNIMATE Signal - series B2C/S2C 3.50 - 2-row; PartNumber: 1358550000; Manufacturer: Weidmueller; Short_text_for_material: S2C-SMT 3.50/08/180LF 3.5SN BK RL; Side_termination_characteristic: Solder flange; Mounting_onto_the_PCB: Reflow solder connection; Pitch_mm: 3.5 mm; Pitch_inch: 0.138 inch; No_of_poles: 8; Outgoing_elbow: 180°; Insulating_material: LCP GF; UL_94_flammability_rating: V-0; Rated_voltage_for_surge_voltage_class_pollution_degree_II_2: 200 V; Rated_current_min_no_of_poles_TU_20_deg_C: 13.4 A; Rated_voltage_use_group_B_UL_1059: 150 V; Rated_current_use_group_B_UL_1059: 10 A; PackageReference: S2C_SMT_3_50_180LF_08; Colour: Black; Solder_pin_length_mm: 3.5 mm; Packaging: Tape; Qty: 175 PCS; Revision: V1; ComponentLink1Description: Manufacturer URL; ComponentLink1URL: http://www.weidmueller.com/; ComponentLink2Description: URL Link1; ComponentLink2URL: http://catalog.weidmueller.com/catalog/Start.do?localeId=en&ObjectID=1358550000
footprint S2C_SMT_3_50_180LF_08 (OMNIMATE Signal - Serie B2C/S2C 3.50 - 2-reihig  S2C-SMT 3.50/08/180LF 3.5)
part A pins: A1
part B pins: A2
part C pins: A3
part D pins: A4
part E pins: B1
part F pins: B2
part G pins: B3
part H pins: B4

## 1358600000
designator J?
OMNIMATE Signal - series B2C/S2C 3.50 - 2-row; PartNumber: 1358600000; Manufacturer: Weidmueller; Short_text_for_material: S2C-SMT 3.50/16/180LF 3.5SN BK RL; Side_termination_characteristic: Solder flange; Mounting_onto_the_PCB: Reflow solder connection; Pitch_mm: 3.5 mm; Pitch_inch: 0.138 inch; No_of_poles: 16; Outgoing_elbow: 180°; Insulating_material: LCP GF; UL_94_flammability_rating: V-0; Rated_voltage_for_surge_voltage_class_pollution_degree_II_2: 200 V; Rated_current_min_no_of_poles_TU_20_deg_C: 13.4 A; Rated_voltage_use_group_B_UL_1059: 150 V; Rated_current_use_group_B_UL_1059: 10 A; PackageReference: S2C_SMT_3_50_180LF_16; Colour: Black; Solder_pin_length_mm: 3.5 mm; Packaging: Tape; Qty: 175 PCS; Revision: V1; ComponentLink1Description: Manufacturer URL; ComponentLink1URL: http://www.weidmueller.com/; ComponentLink2Description: URL Link1; ComponentLink2URL: http://catalog.weidmueller.com/catalog/Start.do?localeId=en&ObjectID=1358600000
footprint S2C_SMT_3_50_180LF_16 (OMNIMATE Signal - Serie B2C/S2C 3.50 - 2-reihig  S2C-SMT 3.50/16/180LF 3.5)
part A pins: A1, A2, A3, A4, A5, A6, A7, A8
part B pins: B1, B2, B3, B4, B5, B6, B7, B8

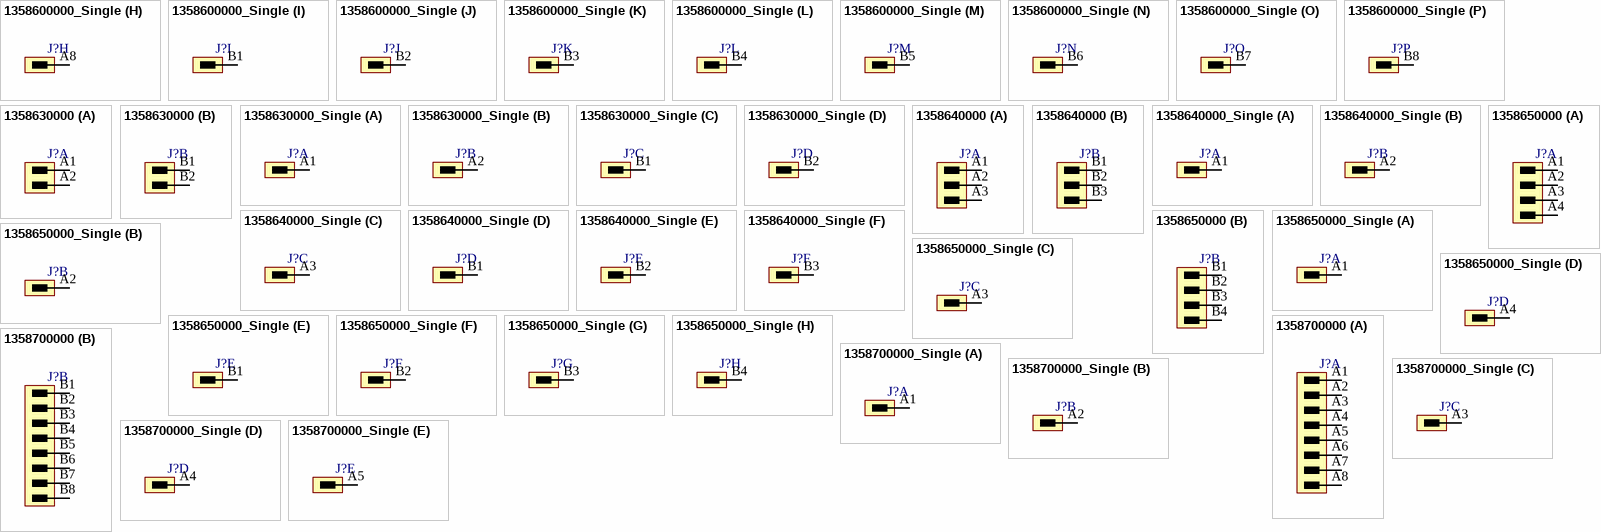
[diagram p59: symbols 1358600000_Single to 1358700000_Single]

## 1358600000_Single
designator J?
OMNIMATE Signal - series B2C/S2C 3.50 - 2-row; PartNumber: 1358600000; Manufacturer: Weidmueller; Short_text_for_material: S2C-SMT 3.50/16/180LF 3.5SN BK RL; Side_termination_characteristic: Solder flange; Mounting_onto_the_PCB: Reflow solder connection; Pitch_mm: 3.5 mm; Pitch_inch: 0.138 inch; No_of_poles: 16; Outgoing_elbow: 180°; Insulating_material: LCP GF; UL_94_flammability_rating: V-0; Rated_voltage_for_surge_voltage_class_pollution_degree_II_2: 200 V; Rated_current_min_no_of_poles_TU_20_deg_C: 13.4 A; Rated_voltage_use_group_B_UL_1059: 150 V; Rated_current_use_group_B_UL_1059: 10 A; PackageReference: S2C_SMT_3_50_180LF_16; Colour: Black; Solder_pin_length_mm: 3.5 mm; Packaging: Tape; Qty: 175 PCS; Revision: V1; ComponentLink1Description: Manufacturer URL; ComponentLink1URL: http://www.weidmueller.com/; ComponentLink2Description: URL Link1; ComponentLink2URL: http://catalog.weidmueller.com/catalog/Start.do?localeId=en&ObjectID=1358600000
footprint S2C_SMT_3_50_180LF_16 (OMNIMATE Signal - Serie B2C/S2C 3.50 - 2-reihig  S2C-SMT 3.50/16/180LF 3.5)
part A pins: A1
part B pins: A2
part C pins: A3
part D pins: A4
part E pins: A5
part F pins: A6
part G pins: A7
part H pins: A8
part I pins: B1
part J pins: B2
part K pins: B3
part L pins: B4
part M pins: B5
part N pins: B6
part O pins: B7
part P pins: B8

## 1358630000
designator J?
OMNIMATE Signal - series B2C/S2C 3.50 - 2-row; PartNumber: 1358630000; Manufacturer: Weidmueller; Short_text_for_material: S2C-SMT 3.50/04/180LF 1.5SN BK RL; Side_termination_characteristic: Solder flange; Mounting_onto_the_PCB: Reflow solder connection; Pitch_mm: 3.5 mm; Pitch_inch: 0.138 inch; No_of_poles: 4; Outgoing_elbow: 180°; Solder_pin_length_mm: 1.5 mm; Insulating_material: LCP GF; UL_94_flammability_rating: V-0; Rated_voltage_for_surge_voltage_class_pollution_degree_II_2: 200 V; Rated_current_min_no_of_poles_TU_20_deg_C: 13.4 A; Rated_voltage_use_group_B_UL_1059: 150 V; Rated_current_use_group_B_UL_1059: 10 A; PackageReference: S2C_SMT_3_50_180LF_04; Colour: Black; Packaging: Tape; Qty: 175 PCS; Revision: V1; ComponentLink1Description: Manufacturer URL; ComponentLink1URL: http://www.weidmueller.com/; ComponentLink2Description: URL Link1; ComponentLink2URL: http://catalog.weidmueller.com/catalog/Start.do?localeId=en&ObjectID=1358630000
footprint S2C_SMT_3_50_180LF_04 (OMNIMATE Signal - Serie B2C/S2C 3.50 - 2-reihig  S2C-SMT 3.50/04/180LF 3.5)
part A pins: A1, A2
part B pins: B1, B2